# Altium footprint library 贴片电感.PcbLib: 92 footprints (part 3 of 6)
Each footprint in its own frame and in the unit in brackets; x right, y up, seen from the top. Pads: shape width x height; smd on the part's side, far side on the other; paste and mask are expansions set on the pad; w line width, h text height; cw(c..) or ccw(c..) is an arc to the next point about the centre after c.
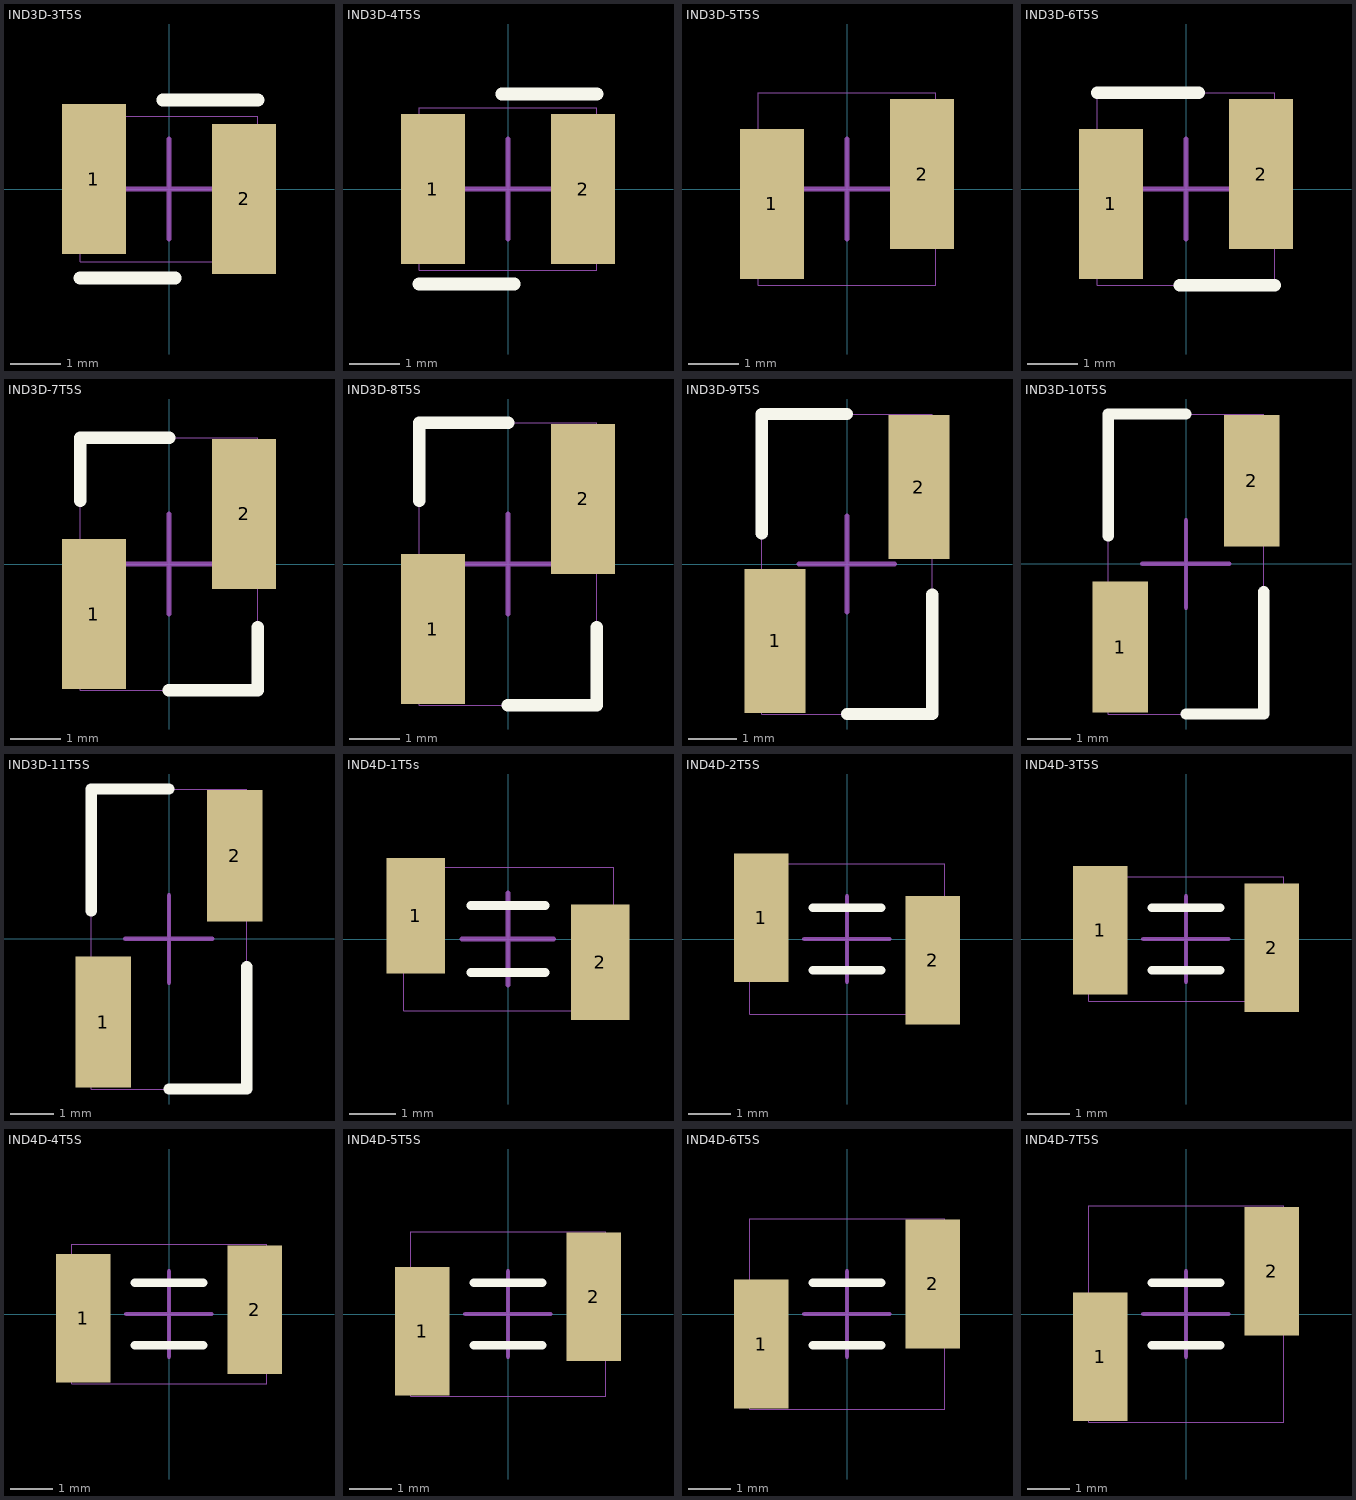
[diagram p2: the footprints below, top view; thin cyan lines are the x and y axes]

## IND3D-3T5S [mm] "贴片空芯线圈"
height 5.2
pads (2):
  rect 1.27x3 smd: 1(-1.5,0.2) 2(1.5,-0.2)
Top Overlay:
  lines w0.254: -1.778,-1.778 0.124,-1.778 ; -0.124,1.778 1.778,1.778
Mechanical 13:
  lines w0.01: -1.775,-1.453 1.775,-1.453 1.775,1.452 -1.775,1.452 -1.775,-1.453
Mechanical 15:
  lines w0.1: -1,0 0.991,0 ; 0,-1 0,1
3D body: height 4.93, standoff 0, extent -1.775,-1.453 1.775,1.452

## IND3D-4T5S [mm] "贴片空芯线圈"
height 5.2
pads (2):
  rect 1.27x3 smd: 1(-1.5,0) 2(1.5,0)
Top Overlay:
  lines w0.254: -1.778,-1.9 0.124,-1.9 ; -0.124,1.9 1.778,1.9
Mechanical 13:
  lines w0.01: -1.775,-1.625 1.775,-1.625 1.775,1.625 -1.775,1.625 -1.775,-1.625
Mechanical 15:
  lines w0.1: -1,0 0.991,0 ; 0,-1 0,1
3D body: height 4.93, standoff 0, extent -1.775,-1.625 1.775,1.625

## IND3D-5T5S [mm] "贴片空芯线圈"
height 5.2
pads (2):
  rect 1.27x3 smd: 1(-1.5,-0.3) 2(1.5,0.3)
Mechanical 13:
  lines w0.01: -1.775,-1.925 -1.775,1.925 1.775,1.925 1.775,-1.925 -1.775,-1.925
Mechanical 15:
  lines w0.1: -1,0 0.991,0 ; 0,-1 0,1
3D body: height 4.93, standoff 0, extent -1.775,-1.925 1.775,1.925

## IND3D-6T5S [mm] "贴片空芯线圈"
height 5.2
pads (2):
  rect 1.27x3 smd: 1(-1.5,-0.3) 2(1.5,0.3)
Top Overlay:
  lines w0.254: -1.775,1.925 0.254,1.925 ; -0.127,-1.925 1.775,-1.925
Mechanical 13:
  lines w0.01: -1.775,-1.925 -1.775,1.925 1.775,1.925 1.775,-1.925 -1.775,-1.925
Mechanical 15:
  lines w0.1: -1,0 0.991,0 ; 0,-1 0,1
3D body: height 4.93, standoff 0, extent -1.775,-1.925 1.775,1.925

## IND3D-7T5S [mm] "贴片空芯线圈"
height 5.2
pads (2):
  rect 1.27x3 smd: 1(-1.5,-1) 2(1.5,1)
Top Overlay:
  lines w0.254: -1.775,1.27 -1.775,2.525 0,2.525 ; 0,-2.525 1.775,-2.525 1.775,-1.27
Mechanical 13:
  lines w0.01: -1.775,-2.525 -1.775,2.525 1.775,2.525 1.775,-2.525 -1.775,-2.525
Mechanical 15:
  lines w0.1: -1,0 0.991,0 ; 0,-1 0,1
3D body: height 4.93, standoff 0, extent -1.775,-2.525 1.775,2.525

## IND3D-8T5S [mm] "贴片空芯线圈"
height 5.2
pads (2):
  rect 1.27x3 smd: 1(-1.5,-1.3) 2(1.5,1.3)
Top Overlay:
  lines w0.254: -1.775,1.27 -1.775,2.825 0,2.825 ; 0,-2.825 1.775,-2.825 1.775,-1.27
Mechanical 13:
  lines w0.01: -1.775,-2.825 -1.775,2.825 1.775,2.825 1.775,-2.825 -1.775,-2.825
Mechanical 15:
  lines w0.1: -1,0 0.991,0 ; 0,-1 0,1
3D body: height 4.93, standoff 0, extent -1.775,-2.825 1.775,2.825

## IND3D-9T5S [mm] "贴片空芯线圈"
height 5.2
pads (2):
  rect 1.27x3 smd: 1(-1.5,-1.6) 2(1.5,1.6)
Top Overlay:
  lines w0.254: -1.775,0.635 -1.775,3.125 0,3.125 ; 0,-3.125 1.775,-3.125 1.775,-0.635
Mechanical 13:
  lines w0.01: -1.775,-3.125 -1.775,3.125 1.775,3.125 1.775,-3.125 -1.775,-3.125
Mechanical 15:
  lines w0.1: -1,0 0.991,0 ; 0,-1 0,1
3D body: height 4.93, standoff 0, extent -1.775,-3.125 1.775,3.125

## IND3D-10T5S [mm] "贴片空芯线圈"
height 5.2
pads (2):
  rect 1.27x3 smd: 1(-1.5,-1.9) 2(1.5,1.9)
Top Overlay:
  lines w0.254: -1.775,0.635 -1.775,3.425 0,3.425 ; 0,-3.429 1.775,-3.429 1.775,-0.635
Mechanical 13:
  lines w0.01: -1.775,-3.429 -1.775,3.425 1.775,3.425 1.775,-3.429 -1.775,-3.429
Mechanical 15:
  lines w0.1: -1,0 0.991,0 ; 0,-1 0,1
3D body: height 4.93, standoff 0, extent -1.775,-3.425 1.775,3.425

## IND3D-11T5S [mm] "贴片空芯线圈"
height 5.2
pads (2):
  rect 1.27x3 smd: 1(-1.5,-1.9) 2(1.5,1.9)
Top Overlay:
  lines w0.254: -1.775,0.635 -1.775,3.425 0,3.425 ; 0,-3.429 1.775,-3.429 1.775,-0.635
Mechanical 13:
  lines w0.01: -1.775,-3.429 -1.775,3.425 1.775,3.425 1.775,-3.429 -1.775,-3.429
Mechanical 15:
  lines w0.1: -1,0 0.991,0 ; 0,-1 0,1
3D body: height 4.93, standoff 0, extent -1.775,-3.425 1.775,4.025

## IND4D-1T5s [mm] "贴片空芯线圈"
height 5.2
pads (2):
  rect 1.27x2.5 smd: 1(-2,0.5) 2(2,-0.5)
Top Overlay:
  lines w0.2: -0.8,-0.725 0.8,-0.725 ; -0.8,0.725 0.8,0.725
Mechanical 13:
  lines w0.01: -2.264,-1.553 -2.264,1.552 2.286,1.552 2.286,-1.553 -2.264,-1.553
Mechanical 15:
  lines w0.1: -1,0 0.991,0 ; 0,-1 0,1
3D body: height 5.43, standoff 0, extent -2.264,-1.553 2.286,1.552

## IND4D-2T5S [mm] "贴片空芯线圈"
height 5.2
pads (2):
  rect 1.27x3 smd: 1(-2,0.5) 2(2,-0.5)
Top Overlay:
  lines w0.2: -0.8,-0.725 0.8,-0.725 ; -0.8,0.725 0.8,0.725
Mechanical 13:
  lines w0.01: -2.264,-1.753 -2.264,1.752 2.286,1.752 2.286,-1.753 -2.264,-1.753
Mechanical 15:
  lines w0.1: -1,0 0.991,0 ; 0,-1 0,1
3D body: height 5.43, standoff 0, extent -2.264,-1.753 2.286,1.752

## IND4D-3T5S [mm] "贴片空芯线圈"
height 5.2
pads (2):
  rect 1.27x3 smd: 1(-2,0.2) 2(2,-0.2)
Top Overlay:
  lines w0.2: -0.8,-0.725 0.8,-0.725 ; -0.8,0.725 0.8,0.725
Mechanical 13:
  lines w0.01: -2.264,-1.453 2.286,-1.453 2.286,1.452 -2.264,1.452 -2.264,-1.453
Mechanical 15:
  lines w0.1: -1,0 0.991,0 ; 0,-1 0,1
3D body: height 5.43, standoff 0, extent -2.264,-1.453 2.286,1.452

## IND4D-4T5S [mm] "贴片空芯线圈"
height 5.2
pads (2):
  rect 1.27x3 smd: 1(-2,-0.1) 2(2,0.1)
Top Overlay:
  lines w0.2: -0.8,-0.725 0.8,-0.725 ; -0.8,0.725 0.8,0.725
Mechanical 13:
  lines w0.01: -2.264,-1.625 -2.264,1.625 2.286,1.625 2.286,-1.625 -2.264,-1.625
Mechanical 15:
  lines w0.1: -1,0 0.991,0 ; 0,-1 0,1
3D body: height 5.43, standoff 0, extent -2.264,-1.625 2.286,1.625

## IND4D-5T5S [mm] "贴片空芯线圈"
height 5.2
pads (2):
  rect 1.27x3 smd: 1(-2,-0.4) 2(2,0.4)
Top Overlay:
  lines w0.2: -0.8,-0.725 0.8,-0.725 ; -0.8,0.725 0.8,0.725
Mechanical 13:
  lines w0.01: -2.264,-1.925 2.286,-1.925 2.286,1.925 -2.264,1.925 -2.264,-1.925
Mechanical 15:
  lines w0.1: -1,0 0.991,0 ; 0,-1 0,1
3D body: height 5.43, standoff 0, extent -2.264,-1.925 2.286,1.925

## IND4D-6T5S [mm] "贴片空芯线圈"
height 5.2
pads (2):
  rect 1.27x3 smd: 1(-2,-0.7) 2(2,0.7)
Top Overlay:
  lines w0.2: -0.8,-0.725 0.8,-0.725 ; -0.8,0.725 0.8,0.725
Mechanical 13:
  lines w0.01: -2.264,-2.225 -2.264,2.225 2.286,2.225 2.286,-2.225 -2.264,-2.225
Mechanical 15:
  lines w0.1: -1,0 0.991,0 ; 0,-1 0,1
3D body: height 5.43, standoff 0, extent -2.264,-2.225 2.286,2.225

## IND4D-7T5S [mm] "贴片空芯线圈"
height 5.2
pads (2):
  rect 1.27x3 smd: 1(-2,-1) 2(2,1)
Top Overlay:
  lines w0.2: -0.8,-0.725 0.8,-0.725 ; -0.8,0.725 0.8,0.725
Mechanical 13:
  lines w0.01: -2.264,-2.525 -2.264,2.525 2.286,2.525 2.286,-2.525 -2.264,-2.525
Mechanical 15:
  lines w0.1: -1,0 0.991,0 ; 0,-1 0,1
3D body: height 5.43, standoff 0, extent -2.264,-2.525 2.286,2.525